# Altium footprint library Vobla.PcbLib: 147 footprints (part 5 of 10)
Each footprint in its own frame and in the unit in brackets; x right, y up, seen from the top. Pads: shape width x height; smd on the part's side, far side on the other; paste and mask are expansions set on the pad; w line width, h text height; cw(c..) or ccw(c..) is an arc to the next point about the centre after c.
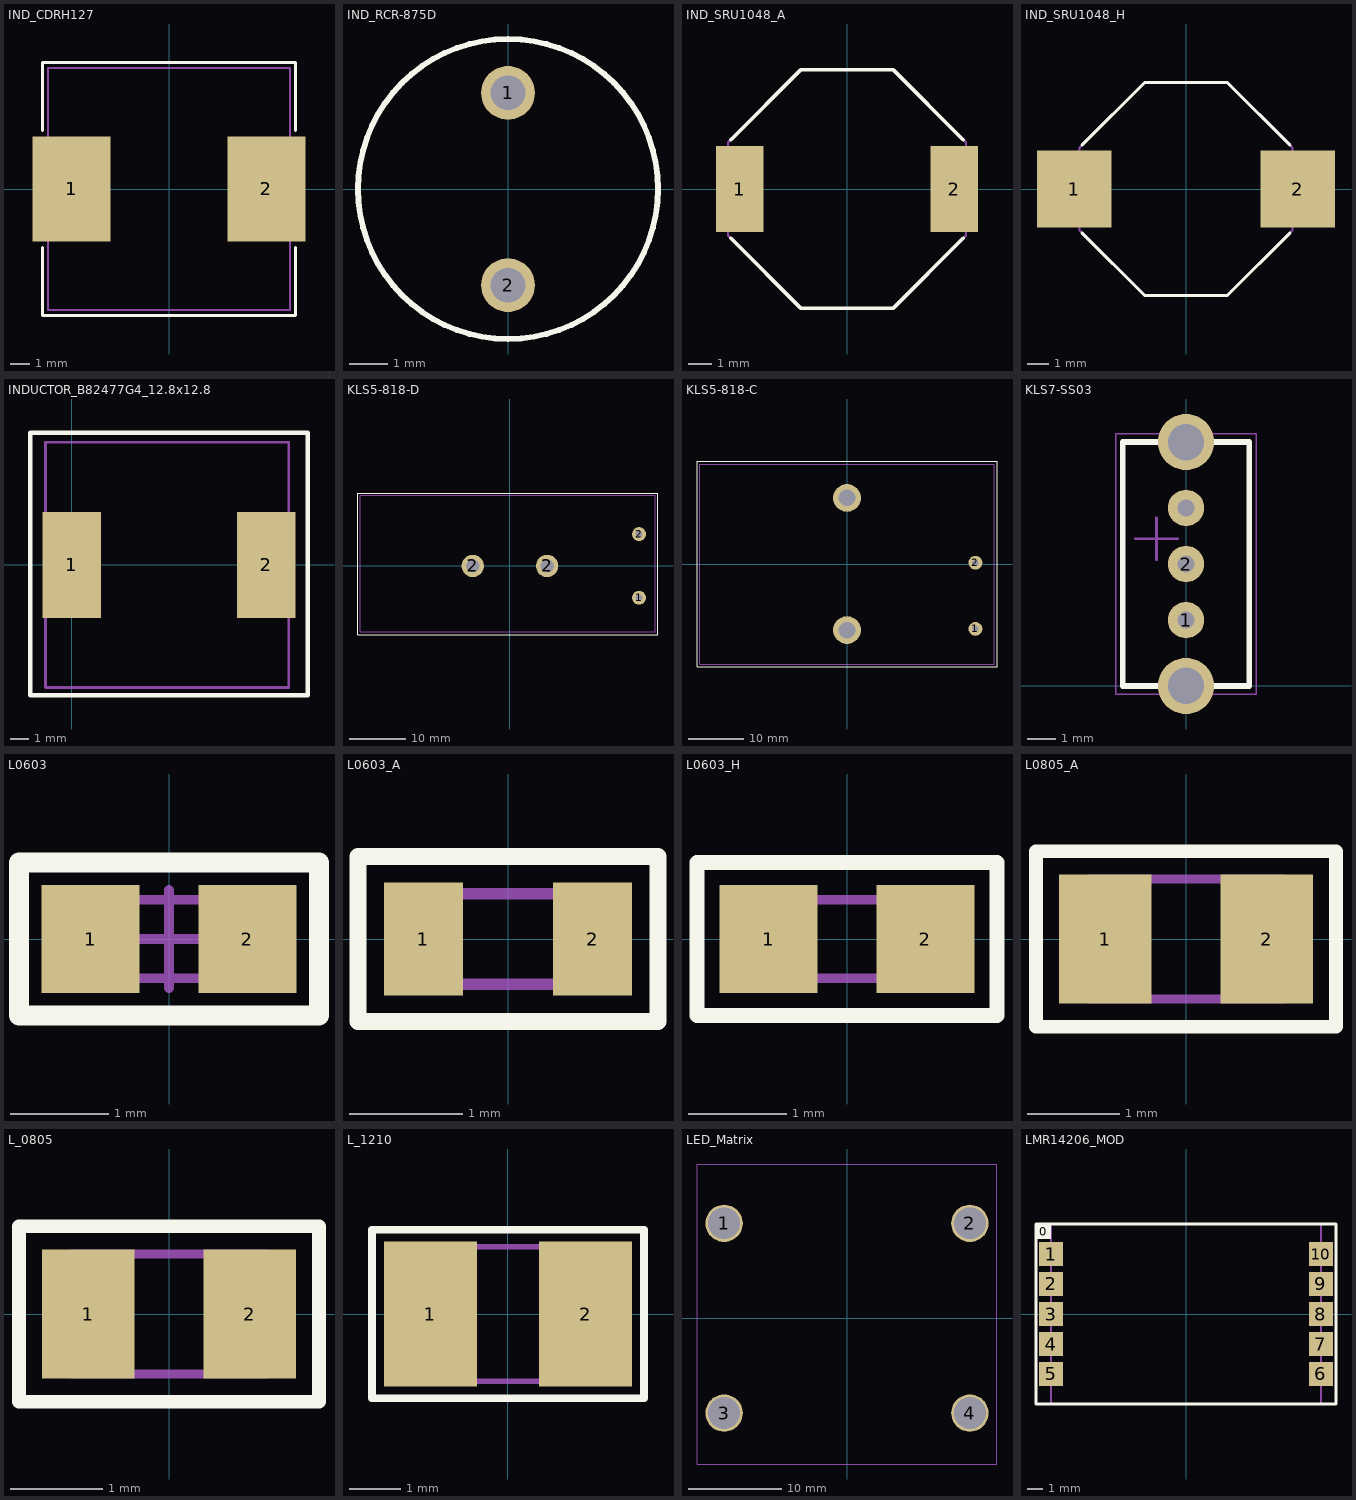
[diagram p4: the footprints below, top view; thin cyan lines are the x and y axes]

## IND_CDRH127 [mm]
pads (2):
  rect 4x5.4 smd: 1(-5,0) 2(5,0)
Top Overlay:
  lines w0.15: -6.5,-3 -6.5,-6.5 6.5,-6.5 6.5,-3 ; -6.5,3 -6.5,6.5 6.5,6.5 6.5,3
Mechanical 7:
  lines w0.1: -6.2,-6.2 -6.2,6.2 6.2,6.2 6.2,-6.2 -6.2,-6.2
Mechanical 10:
  text ".Comment" at -1.1,-6.1 h0.6
  text ".Designator" at -1.5,5.5 h0.8
3D body: height 8, standoff 0.2, extent -6.2,-6.2 6.2,6.2

## IND_RCR-875D [mm]
height 7.5
pads (2):
  round 1.4 hole 0.9: 1(0,2.5) 2(0,-2.5)
Top Overlay:
  circle w0.15: c0,0 r3.9
Mechanical 7:
  circle w0.1: c0,0 r3.9
Mechanical 10:
  text ".Comment" at -1.245,4.335 h0.6
  text ".Designator" at -1.255,4.905 h0.8
3D body: height 7.5, standoff 0, extent -3.869,-3.892 3.9,3.892

## IND_SRU1048_A [mm]
height 5.1
pads (2):
  rect 2x3.6 smd: 1(-4.5,0) 2(4.5,0)
Top Overlay:
  lines w0.15: -4.875,-2.075 -1.95,-5 1.95,-5 4.875,-2.075 ; -4.875,2.075 -1.95,5 1.95,5 4.875,2.075
Mechanical 7:
  lines w0.1: -5,-1.95 -5,1.95 -1.95,5 1.95,5 5,1.95 5,-1.95 1.95,-5 -1.95,-5 -5,-1.95
Mechanical 10:
  text ".Comment" at -1.235,5.625 h0.6
  text ".Designator" at -1.235,6.315 h0.8
3D body: height 5.1, standoff 0, extent -5,-5 5,5

## IND_SRU1048_H [mm]
height 5.1
pads (2):
  rect 3.5x3.6 smd: 1(-5.25,0) 2(5.25,0)
Top Overlay:
  lines w0.15: -4.875,-2.075 -1.95,-5 1.95,-5 4.875,-2.075 ; -4.875,2.075 -1.95,5 1.95,5 4.875,2.075
Mechanical 7:
  lines w0.1: -5,-1.95 -5,1.95 -1.95,5 1.95,5 5,1.95 5,-1.95 1.95,-5 -1.95,-5 -5,-1.95
Mechanical 10:
  text ".Comment" at -1.235,5.625 h0.6
  text ".Designator" at -1.235,6.315 h0.8
3D body: height 5.1, standoff 0, extent -5,-5 5,5

## INDUCTOR_B82477G4_12.8x12.8 [mm] "Катушка индуктивности SMD"
pads (2):
  rect 3.1x5.6 smd: 1(0,0) 2(10.3,0)
Top Overlay:
  lines w0.25: -2.2,-6.9 -2.2,7 12.5,7 12.5,-6.9 -2.2,-6.9
Mechanical 7:
  lines w0.15: -1.4,-6.5 11.5,-6.5 11.5,6.5 -1.4,6.5 -1.4,-6.5
3D body "User Library-b82477g4.step": height 8, standoff 0, extent -1.3,-6.4 11.5,6.4

## KLS5-818-D [mm]
pads (4):
  round 2.5 hole 1.25: 1(23.11,-5.69) 2(23.11,5.69)
  round 4 hole 2.4: 2(-6.65,0) 2(6.65,0)
Top Overlay:
  lines w0.15: -27.2,-12.3 26.5,-12.3 26.5,13 -27.2,13 -27.2,-12.3
Mechanical 7:
  lines w0.1: -26.8,-11.8 -26.8,12.7 26,12.7 26,-11.8 -26.8,-11.8
3D body "User Library-koszyk 2xAAA_214.STEP": height 13.03, standoff 0.03, extent -26.795,-11.811 26.008,12.689

## KLS5-818-С [mm] "Батарейный отсек 3хААА"
pads (4):
  round 2.5 hole 1.2: 1(23.11,-11.67) 2(23.11,0.23)
  round 5 hole 3: ""(0,-11.9) ""(0,11.9)
Top Overlay:
  lines w0.15: -27,-18.5 -27,18.5 27,18.5 27,-18.5 -27,-18.5
Mechanical 7:
  lines w0.1: -26.5,-18 26.5,-18 26.5,18 -26.5,18 -26.5,-18
3D body "User Library-3x AAA battery holder_update.STEP": height 13, standoff 0, extent -26.491,-18 26.491,18

## KLS7-SS03 [mm] "Переключатель движковый"
pads (5):
  round 1.3 hole 0.6: 1(0,2.35) 2(0,4.35) ""(0,6.35)
  round 2 hole 1.3: ""(0,0) ""(0,8.7)
Top Overlay:
  lines w0.2: -2.25,0 -2.25,8.7 2.25,8.7 2.25,0 -2.25,0
Mechanical 9:
  text ".Designator" at 3.5,4.5 h1
  text ".Comment" at 3.5,5.5 h0.8
Mechanical 11:
  lines w0.1: -2.25,0 2.25,0 2.25,8.7 -2.25,8.7 -2.25,0
Mechanical 15:
  lines w0.05: -2.5,-0.3 -2.5,9 2.5,9 2.5,-0.3 -2.5,-0.3
  lines w0.1: -1.8,5.25 -0.3,5.25 ; -1.05,4.5 -1.05,6

## L0603 [mm]
height 0.8
pads (2):
  rect 1x1.1 smd: 1(-0.8,0) 2(0.8,0)
Top Overlay:
  lines w0.2: -1.53,-0.78 -1.53,0.78 1.53,0.78 1.53,-0.78 -1.53,-0.78
Mechanical 9:
  text ".Designator" at -1,0.25 h1
  text ".Comment" at -1,-0.5 h0.8
Mechanical 11:
  lines w0.1: -0.8,-0.4 -0.8,0.4 0.8,0.4 0.8,-0.4 -0.8,-0.4
Mechanical 15:
  lines w0.05: -1.53,-0.78 1.53,-0.78 1.53,0.78 -1.53,0.78 -1.53,-0.78
  lines w0.1: -0.5,0 0.5,0 ; 0,-0.5 0,0.5
3D body: height 0.8, standoff 0, extent -0.8,-0.4 0.8,0.4

## L0603_A [mm]
height 0.8
pads (2):
  rect 0.7x1 smd: 1(-0.75,0) 2(0.75,0)
Top Overlay:
  lines w0.15: -1.33,-0.73 1.33,-0.73 1.33,0.73 -1.33,0.73 -1.33,-0.73
Mechanical 7:
  lines w0.1: -0.8,-0.4 -0.8,0.4 0.8,0.4 0.8,-0.4 -0.8,-0.4
Mechanical 10:
  text ".Designator" at -0.62,1 h0.8
  text ".Comment" at -0.75,-1.28 h0.6
3D body: height 0.8, standoff 0, extent -0.8,-0.4 0.8,0.4

## L0603_H [mm]
height 0.8
pads (2):
  rect 1x1.1 smd: 1(-0.8,0) 2(0.8,0)
Top Overlay:
  lines w0.15: -1.53,-0.78 1.53,-0.78 1.53,0.78 -1.53,0.78 -1.53,-0.78
Mechanical 7:
  lines w0.1: -0.8,-0.4 -0.8,0.4 0.8,0.4 0.8,-0.4 -0.8,-0.4
Mechanical 10:
  text ".Comment" at -0.61,-1.33 h0.6
  text ".Designator" at -0.62,1 h0.8
3D body: height 0.8, standoff 0, extent -0.8,-0.4 0.8,0.4

## L0805_A [mm]
height 1.4
pads (2):
  rect 1x1.4 smd: 1(-0.875,0) 2(0.875,0)
Top Overlay:
  lines w0.15: -1.625,-0.95 1.625,-0.95 1.625,0.95 -1.625,0.95 -1.625,-0.95
Mechanical 7:
  lines w0.1: -1.05,-0.65 1.05,-0.65 1.05,0.65 -1.05,0.65 -1.05,-0.65
Mechanical 10:
  text ".Comment" at -1.125,-1.625 h0.6
  text ".Designator" at -1.525,1.375 h0.8
3D body: height 1.4, standoff 0, extent -1.05,-0.65 1.05,0.65

## L_0805 [mm] "SMD LED LAMP"
height 1.4
pads (2):
  rect 1x1.4 smd: 1(-0.875,0) 2(0.875,0)
Top Overlay:
  lines w0.15: -1.625,-0.95 -1.625,0.95 1.625,0.95 1.625,-0.95 -1.625,-0.95
Mechanical 7:
  lines w0.1: -1.05,-0.65 -1.05,0.65 1.05,0.65 1.05,-0.65 -1.05,-0.65
Mechanical 10:
  text ".Designator" at -1.525,1.375 h0.8
  text ".Comment" at -1.125,-1.625 h0.6
3D body "Led_Red_0805.STEP": height 1.1, standoff 0, extent -1.01,-0.625 1.01,0.625

## L_1210 [mm]
height 0.55
pads (2):
  rect 1.8x2.8 smd: 1(-1.5,0) 2(1.5,0)
Top Overlay:
  lines w0.15: -2.63,-1.63 -2.63,1.63 2.63,1.63 2.63,-1.63 -2.63,-1.63
Mechanical 7:
  lines w0.1: -1.6,-1.3 -1.6,1.3 1.6,1.3 1.6,-1.3 -1.6,-1.3
Mechanical 10:
  text ".Comment" at -0.81,-2.25 h0.6
  text ".Designator" at -0.71,1.89 h0.8
3D body: height 0.55, standoff 0, extent -1.55,-1.3 1.55,1.3

## LED_Matrix [mm] "Светодиодная матрица 8х8 32х32"
pads (4):
  round 4 hole 3.4: 1(-13.15,10.15) 2(13.15,10.15) 3(-13.15,-10.15) 4(13.15,-10.15)
Mechanical 11:
  lines w0.1: -16,-15.6 -16,16.5 16,16.5 16,-15.6 -16,-15.6
3D body "dotmatrixModule.STEP": height 23.7, standoff -5, extent -16.05,-15.6 16.05,16.5

## LMR14206_MOD [mm]
height 5
pads (11):
  rect 1x1 on Top Overlay: 0(-9.5,5.5)
  rect 1.6x1.6 smd: 1(-9,4) 2(-9,2) 3(-9,0) 4(-9,-2) 5(-9,-4) 6(9,-4) 7(9,-2) 8(9,0) 9(9,2) 10(9,4)
Top Overlay:
  lines w0.2: -10,-6 -10,6 10,6 10,-6 -10,-6
Mechanical 9:
  text ".Designator" at -2.05,1.5 h0.8
  text ".Comment" at -2.35,2.3 h0.8
Mechanical 11:
  lines w0.15: -9,-6 9,-6 9,6 -9,6 -9,-6
3D body "KPTV.E11.013.98.00.step": height 3.5, standoff 0.09, extent -9,-6 9,6